# Altium footprint library 6-Connectors-3.PcbLib: 153 footprints (part 5 of 11) (continued)
## PHOENIX_1755778 [mm] "PCB Header, 12A 250 V, Pitch: 2.54mm, 6 Positions, MSTBVA Serie" (continued)
  text "6" at 12.365,3.46 h1
  text "5" at 7.285,3.46 h1
  text "1" at -12.86,3.46 h1
  text "5" at 7.285,3.46 h1
  text "4" at 2.205,3.46 h1
  text "3" at -2.875,3.46 h1
  text "2" at -7.955,3.46 h1
Mechanical 8:
  lines w0.1: -13.2,0 -12.7,0 ; -12.7,-0.5 -12.7,0 ; -12.7,0.5 -12.7,0 ; -12.2,0 -12.7,0 ; -8.12,0 -7.62,0 ; -7.62,-0.5 -7.62,0 ; -7.62,0.5 -7.62,0 ; -7.12,0 -7.62,0 ; -3.04,0 -2.54,0 ; -2.54,-0.5 -2.54,0 ; -2.54,0.5 -2.54,0 ; -2.04,0 -2.54,0 ; -0.5,0 0,0 ; 0,-0.5 0,0 ; 0,0.5 0,0 ; 0.5,0 0,0 ; 2.04,0 2.54,0 ; 2.54,-0.5 2.54,0 ; 2.54,0.5 2.54,0 ; 3.04,0 2.54,0 ; 7.12,0 7.62,0 ; 7.62,-0.5 7.62,0 ; 7.62,0.5 7.62,0 ; 8.12,0 7.62,0 ; 12.2,0 12.7,0 ; 12.7,-0.5 12.7,0 ; 12.7,0.5 12.7,0 ; 13.2,0 12.7,0
Mechanical 14:
  drawing of 207 lines, arcs and shapes, not listed
  text "6" at 12.365,3.46 h1
  text "5" at 7.285,3.46 h1
  text "5" at 7.285,3.46 h1
  text "4" at 2.205,3.46 h1
  text "3" at -2.875,3.46 h1
  text "2" at -7.955,3.46 h1
  text "1" at -12.86,3.46 h1
3D body "PHOENIX_1755778.stp": height 12, standoff -3.9, extent -16.24,-3.8 16.24,4.8

## PHOENIX_1755794 [mm] "PCB Header, 12A 250 V, Pitch: 2.54mm, 8 Positions, MSTBVA Serie"
height 12
pads (8):
  round 2.1 hole 1.4: 1(-17.78,0) 2(-12.7,0) 3(-7.62,0) 4(-2.54,0) 5(2.54,0) 6(7.62,0) 7(12.7,0) 8(17.78,0)
Top Overlay:
  drawing of 154 lines, arcs and shapes, not listed
  text "5" at 2.205,3.46 h1
  text "4" at -2.875,3.46 h1
  text "3" at -7.955,3.46 h1
  text "2" at -13.035,3.46 h1
  text "1" at -17.94,3.46 h1
  text "6" at 7.285,3.46 h1
  text "7" at 12.365,3.46 h1
  text "8" at 17.445,3.46 h1
Mechanical 8:
  lines w0.1: -18.28,0 -17.78,0 ; -17.78,-0.5 -17.78,0 ; -17.78,0.5 -17.78,0 ; -17.28,0 -17.78,0 ; -13.2,0 -12.7,0 ; -12.7,-0.5 -12.7,0 ; -12.7,0.5 -12.7,0 ; -12.2,0 -12.7,0 ; -8.12,0 -7.62,0 ; -7.62,-0.5 -7.62,0 ; -7.62,0.5 -7.62,0 ; -7.12,0 -7.62,0 ; -3.04,0 -2.54,0 ; -2.54,-0.5 -2.54,0 ; -2.54,0.5 -2.54,0 ; -2.04,0 -2.54,0 ; -0.5,0 0,0 ; 0,-0.5 0,0 ; 0,0.5 0,0 ; 0.5,0 0,0 ; 2.04,0 2.54,0 ; 2.54,-0.5 2.54,0 ; 2.54,0.5 2.54,0 ; 3.04,0 2.54,0 ; 7.12,0 7.62,0 ; 7.62,-0.5 7.62,0 ; 7.62,0.5 7.62,0 ; 8.12,0 7.62,0 ; 12.2,0 12.7,0 ; 12.7,-0.5 12.7,0 ; 12.7,0.5 12.7,0 ; 13.2,0 12.7,0 ; 17.28,0 17.78,0 ; 17.78,-0.5 17.78,0 ; 17.78,0.5 17.78,0 ; 18.28,0 17.78,0
Mechanical 14:
  drawing of 259 lines, arcs and shapes, not listed
  text "5" at 2.205,3.46 h1
  text "4" at -2.875,3.46 h1
  text "3" at -7.955,3.46 h1
  text "2" at -13.035,3.46 h1
  text "1" at -17.94,3.46 h1
  text "6" at 7.285,3.46 h1
  text "7" at 12.365,3.46 h1
  text "8" at 17.445,3.46 h1
3D body "PHOENIX_1755794.stp": height 12, standoff -3.9, extent -21.32,-3.8 21.32,4.8

## PHOENIX_1757242 [mm] "PHOENIX MSTBA Serie, Pitch 5.08mm, 12A, 250V, 2 Positions Header"
height 8.6
pads (2):
  round 2.1 hole 1.4: 1(-2.54,0) 2(2.54,0)
Top Overlay:
  lines w0.2: -6.08,-8.626 6.08,-8.626 ; -6.08,-7 6.08,-7 ; -3.515,-10 -3.145,-8.7 -1.935,-8.7 -1.565,-10 ; -3.196,-8.88 -1.884,-8.88 ; -2.785,-8.7 -2.772,-8.75 -2.308,-8.75 -2.295,-8.7 ; 1.565,-10 1.935,-8.7 3.145,-8.7 3.515,-10 ; 1.884,-8.88 3.196,-8.88 ; 2.295,-8.7 2.308,-8.75 2.772,-8.75 2.785,-8.7 ; -6.08,-10 6.08,-10 6.08,2 -6.08,2 -6.08,-10 ; -5.281,-1.05 -5.08,-1.8 -4.879,-1.05 -5.281,-1.05 ; -0.201,-1.05 0,-1.8 0.201,-1.05 -0.201,-1.05 ; 4.879,-1.05 5.08,-1.8 5.281,-1.05 4.879,-1.05
  text "1" at -2.9,-2.4 h1
  text "2" at 2.1,-2.4 h1
Mechanical 8:
  lines w0.1: -3.04,0 -2.54,0 ; -2.54,-0.5 -2.54,0 ; -2.54,0.5 -2.54,0 ; -2.04,0 -2.54,0 ; -0.5,0 0,0 ; 0,-0.5 0,0 ; 0,0.5 0,0 ; 0.5,0 0,0 ; 2.04,0 2.54,0 ; 2.54,-0.5 2.54,0 ; 2.54,0.5 2.54,0 ; 3.04,0 2.54,0
Mechanical 14:
  lines w0.1: -6.08,-8.626 6.08,-8.626 ; -6.08,-7 6.08,-7 ; -3.515,-10 -3.145,-8.7 -1.935,-8.7 -1.565,-10 ; -3.196,-8.88 -1.884,-8.88 ; -2.785,-8.7 -2.772,-8.75 -2.308,-8.75 -2.295,-8.7 ; 1.565,-10 1.935,-8.7 3.145,-8.7 3.515,-10 ; 1.884,-8.88 3.196,-8.88 ; 2.295,-8.7 2.308,-8.75 2.772,-8.75 2.785,-8.7 ; -6.08,-10 6.08,-10 6.08,2 -6.08,2 -6.08,-10 ; -5.281,-1.05 -5.08,-1.8 -4.879,-1.05 -5.281,-1.05 ; -0.201,-1.05 0,-1.8 0.201,-1.05 -0.201,-1.05 ; 4.879,-1.05 5.08,-1.8 5.281,-1.05 4.879,-1.05
3D body "PHOENIX_1757242.stp": height 8.6, standoff -3, extent -6.08,-10 6.08,2.002

## PHOENIX_1757255 [mm] "PHOENIX MSTBA Serie, Pitch 5.08mm, 12A, 250V, 3 Positions Header"
height 8.6
pads (3):
  round 2.1 hole 1.4: 1(-5.08,0) 2(0,0) 3(5.08,0)
Top Overlay:
  lines w0.2: -8.62,-8.626 8.62,-8.626 ; -8.62,-7 8.62,-7 ; -6.055,-10 -5.685,-8.7 -4.475,-8.7 -4.105,-10 ; -5.736,-8.88 -4.424,-8.88 ; -5.325,-8.7 -5.312,-8.75 -4.848,-8.75 -4.835,-8.7 ; -0.975,-10 -0.605,-8.7 0.605,-8.7 0.975,-10 ; -0.656,-8.88 0.656,-8.88 ; -0.245,-8.7 -0.232,-8.75 0.232,-8.75 0.245,-8.7 ; 4.105,-10 4.475,-8.7 5.685,-8.7 6.055,-10 ; 4.424,-8.88 5.736,-8.88 ; 4.835,-8.7 4.848,-8.75 5.312,-8.75 5.325,-8.7 ; -8.62,-10 8.62,-10 8.62,2 -8.62,2 -8.62,-10 ; -2.741,-1.05 -2.54,-1.8 -2.339,-1.05 -2.741,-1.05 ; 2.339,-1.05 2.54,-1.8 2.741,-1.05 2.339,-1.05
  text "3" at 4.64,-2.4 h1
  text "2" at -0.36,-2.4 h1
  text "1" at -5.36,-2.4 h1
Mechanical 8:
  lines w0.1: -5.58,0 -5.08,0 ; -5.08,-0.5 -5.08,0 ; -5.08,0.5 -5.08,0 ; -4.58,0 -5.08,0 ; 4.58,0 5.08,0 ; 5.08,-0.5 5.08,0 ; 5.08,0.5 5.08,0 ; 5.58,0 5.08,0 ; 0,0 0,0.5 0,0 ; 0,0 0.5,0 0,0 ; 0,0 0,-0.5 0,0 ; 0,0 -0.5,0 0,0
Mechanical 14:
  lines w0.1: -8.62,-8.626 8.62,-8.626 ; -8.62,-7 8.62,-7 ; -6.055,-10 -5.685,-8.7 -4.475,-8.7 -4.105,-10 ; -5.736,-8.88 -4.424,-8.88 ; -5.325,-8.7 -5.312,-8.75 -4.848,-8.75 -4.835,-8.7 ; -0.975,-10 -0.605,-8.7 0.605,-8.7 0.975,-10 ; -0.656,-8.88 0.656,-8.88 ; -0.245,-8.7 -0.232,-8.75 0.232,-8.75 0.245,-8.7 ; 4.105,-10 4.475,-8.7 5.685,-8.7 6.055,-10 ; 4.424,-8.88 5.736,-8.88 ; 4.835,-8.7 4.848,-8.75 5.312,-8.75 5.325,-8.7 ; -8.62,-10 8.62,-10 8.62,2 -8.62,2 -8.62,-10 ; -2.741,-1.05 -2.54,-1.8 -2.339,-1.05 -2.741,-1.05 ; 2.339,-1.05 2.54,-1.8 2.741,-1.05 2.339,-1.05
3D body "PHOENIX_1757255.stp": height 8.6, standoff -3.5, extent -8.62,-10 8.62,2.002

## PHOENIX_1757268 [mm] "PHOENIX MSTBA Serie, Pitch 5.08mm, 12A, 250V, 4 Positions Header"
height 8.6
pads (4):
  round 2.1 hole 1.4: 1(-7.62,0) 2(-2.54,0) 3(2.54,0) 4(7.62,0)
Top Overlay:
  lines w0.2: -11.16,-8.626 11.16,-8.626 ; -11.16,-7 11.16,-7 ; -8.595,-10 -8.225,-8.7 -7.015,-8.7 -6.645,-10 ; -8.276,-8.88 -6.964,-8.88 ; -3.515,-10 -3.145,-8.7 -1.935,-8.7 -1.565,-10 ; -3.196,-8.88 -1.884,-8.88 ; 1.565,-10 1.935,-8.7 3.145,-8.7 3.515,-10 ; 1.884,-8.88 3.196,-8.88 ; 6.645,-10 7.015,-8.7 8.225,-8.7 8.595,-10 ; 6.964,-8.88 8.276,-8.88 ; -11.16,-10 -11.16,2 11.16,2 11.16,-10 -11.16,-10 ; -5.281,-1.05 -4.879,-1.05 -5.08,-1.8 -5.281,-1.05 ; -0.201,-1.05 0.201,-1.05 0,-1.8 -0.201,-1.05 ; 4.879,-1.05 5.281,-1.05 5.08,-1.8 4.879,-1.05
  text "3" at 2.1,-2.4 h1
  text "2" at -2.9,-2.4 h1
  text "1" at -7.9,-2.4 h1
  text "4" at 7.3,-2.4 h1
Mechanical 8:
  lines w0.1: -8.12,0 -7.62,0 ; -7.62,-0.5 -7.62,0 ; -7.62,0.5 -7.62,0 ; -7.12,0 -7.62,0 ; -3.04,0 -2.54,0 ; -2.54,-0.5 -2.54,0 ; -2.54,0.5 -2.54,0 ; -2.04,0 -2.54,0 ; -0.5,0 0,0 ; 0,-0.5 0,0 ; 0,0.5 0,0 ; 0.5,0 0,0 ; 2.04,0 2.54,0 ; 2.54,-0.5 2.54,0 ; 2.54,0.5 2.54,0 ; 3.04,0 2.54,0 ; 7.12,0 7.62,0 ; 7.62,-0.5 7.62,0 ; 7.62,0.5 7.62,0 ; 8.12,0 7.62,0
Mechanical 14:
  lines w0.1: -11.16,-8.626 11.16,-8.626 ; -11.16,-7 11.16,-7 ; -8.595,-10 -8.225,-8.7 -7.015,-8.7 -6.645,-10 ; -8.276,-8.88 -6.964,-8.88 ; -7.865,-8.7 -7.852,-8.75 -7.388,-8.75 -7.375,-8.7 ; -3.515,-10 -3.145,-8.7 -1.935,-8.7 -1.565,-10 ; -3.196,-8.88 -1.884,-8.88 ; -2.785,-8.7 -2.772,-8.75 -2.308,-8.75 -2.295,-8.7 ; 1.565,-10 1.935,-8.7 3.145,-8.7 3.515,-10 ; 1.884,-8.88 3.196,-8.88 ; 2.295,-8.7 2.308,-8.75 2.772,-8.75 2.785,-8.7 ; 6.645,-10 7.015,-8.7 8.225,-8.7 8.595,-10 ; 6.964,-8.88 8.276,-8.88 ; 7.375,-8.7 7.388,-8.75 7.852,-8.75 7.865,-8.7 ; -11.16,-10 -11.16,2 11.16,2 11.16,-10 -11.16,-10 ; -5.281,-1.05 -4.879,-1.05 -5.08,-1.8 -5.281,-1.05 ; -0.201,-1.05 0.201,-1.05 0,-1.8 -0.201,-1.05 ; 4.879,-1.05 5.281,-1.05 5.08,-1.8 4.879,-1.05
3D body "PHOENIX_1757268.stp": height 8.6, standoff -3.5, extent -11.16,-10 11.16,2.002

## PHOENIX_1757271 [mm] "PHOENIX MSTBA Serie, Pitch 5.08mm, 12A, 250V, 5 Positions Header"
height 8.6
pads (5):
  round 2.1 hole 1.4: 1(-10.16,0) 2(-5.08,0) 3(0,0) 4(5.08,0) 5(10.16,0)
Top Overlay:
  lines w0.2: -13.7,-8.626 13.7,-8.626 ; -13.7,-7 13.7,-7 ; -11.135,-10 -10.765,-8.7 -9.555,-8.7 -9.185,-10 ; -10.816,-8.88 -9.504,-8.88 ; -10.405,-8.7 -10.392,-8.75 -9.928,-8.75 -9.915,-8.7 ; -6.055,-10 -5.685,-8.7 -4.475,-8.7 -4.105,-10 ; -5.736,-8.88 -4.424,-8.88 ; -5.325,-8.7 -5.312,-8.75 -4.848,-8.75 -4.835,-8.7 ; -0.975,-10 -0.605,-8.7 0.605,-8.7 0.975,-10 ; -0.656,-8.88 0.656,-8.88 ; -0.245,-8.7 -0.232,-8.75 0.232,-8.75 0.245,-8.7 ; 4.105,-10 4.475,-8.7 5.685,-8.7 6.055,-10 ; 4.424,-8.88 5.736,-8.88 ; 4.835,-8.7 4.848,-8.75 5.312,-8.75 5.325,-8.7 ; 9.185,-10 9.555,-8.7 10.765,-8.7 11.135,-10 ; 9.504,-8.88 10.816,-8.88 ; 9.915,-8.7 9.928,-8.75 10.392,-8.75 10.405,-8.7 ; -13.7,-10 -13.7,2 13.7,2 13.7,-10 -13.7,-10 ; -7.821,-1.05 -7.62,-1.8 -7.419,-1.05 -7.821,-1.05 ; -2.741,-1.05 -2.54,-1.8 -2.339,-1.05 -2.741,-1.05 ; 2.339,-1.05 2.54,-1.8 2.741,-1.05 2.339,-1.05 ; 7.419,-1.05 7.62,-1.8 7.821,-1.05 7.419,-1.05
  text "5" at 9.72,-2.4 h1
  text "4" at 4.64,-2.4 h1
  text "3" at -0.44,-2.4 h1
  text "2" at -5.44,-2.4 h1
  text "1" at -10.44,-2.4 h1
Mechanical 8:
  lines w0.1: -0.5,0 0,0 ; 0,-0.5 0,0 ; 0,0.5 0,0 ; 0.5,0 0,0 ; -10.16,0 -10.66,0 -10.16,0 ; -10.16,0 -10.16,-0.5 -10.16,0 ; -10.16,0 -9.66,0 -10.16,0 ; -10.16,0 -10.16,0.5 -10.16,0 ; -5.08,0 -5.58,0 -5.08,0 ; -5.08,0 -5.08,-0.5 -5.08,0 ; -5.08,0 -4.58,0 -5.08,0 ; -5.08,0 -5.08,0.5 -5.08,0 ; 5.08,0 4.58,0 5.08,0 ; 5.08,0 5.08,-0.5 5.08,0 ; 5.08,0 5.58,0 5.08,0 ; 5.08,0 5.08,0.5 5.08,0 ; 10.16,0 9.66,0 10.16,0 ; 10.16,0 10.16,-0.5 10.16,0 ; 10.16,0 10.66,0 10.16,0 ; 10.16,0 10.16,0.5 10.16,0
Mechanical 14:
  lines w0.1: -13.7,-8.626 13.7,-8.626 ; -13.7,-7 13.7,-7 ; -11.135,-10 -10.765,-8.7 -9.555,-8.7 -9.185,-10 ; -10.816,-8.88 -9.504,-8.88 ; -10.405,-8.7 -10.392,-8.75 -9.928,-8.75 -9.915,-8.7 ; -6.055,-10 -5.685,-8.7 -4.475,-8.7 -4.105,-10 ; -5.736,-8.88 -4.424,-8.88 ; -5.325,-8.7 -5.312,-8.75 -4.848,-8.75 -4.835,-8.7 ; -0.975,-10 -0.605,-8.7 0.605,-8.7 0.975,-10 ; -0.656,-8.88 0.656,-8.88 ; -0.245,-8.7 -0.232,-8.75 0.232,-8.75 0.245,-8.7 ; 4.105,-10 4.475,-8.7 5.685,-8.7 6.055,-10 ; 4.424,-8.88 5.736,-8.88 ; 4.835,-8.7 4.848,-8.75 5.312,-8.75 5.325,-8.7 ; 9.185,-10 9.555,-8.7 10.765,-8.7 11.135,-10 ; 9.504,-8.88 10.816,-8.88 ; 9.915,-8.7 9.928,-8.75 10.392,-8.75 10.405,-8.7 ; -13.7,-10 -13.7,2 13.7,2 13.7,-10 -13.7,-10 ; -7.821,-1.05 -7.62,-1.8 -7.419,-1.05 -7.821,-1.05 ; -2.741,-1.05 -2.54,-1.8 -2.339,-1.05 -2.741,-1.05 ; 2.339,-1.05 2.54,-1.8 2.741,-1.05 2.339,-1.05 ; 7.419,-1.05 7.62,-1.8 7.821,-1.05 7.419,-1.05
3D body "PHOENIX_1757271.stp": height 8.6, standoff -3.5, extent -13.7,-10 13.7,2.002

## PHOENIX_1757284 [mm] "PHOENIX MSTBA Serie, Pitch 5.08mm, 12A, 250V, 6 Positions Header"
height 8.6
pads (6):
  round 2.1 hole 1.4: 1(-12.7,0) 2(-7.62,0) 3(-2.54,0) 4(2.54,0) 5(7.62,0) 6(12.7,0)
Top Overlay:
  lines w0.2: -16.24,-8.626 16.24,-8.626 ; -16.24,-7 16.24,-7 ; -13.675,-10 -13.305,-8.7 -12.095,-8.7 -11.725,-10 ; -13.356,-8.88 -12.044,-8.88 ; -12.945,-8.7 -12.932,-8.75 -12.468,-8.75 -12.455,-8.7 ; -8.595,-10 -8.225,-8.7 -7.015,-8.7 -6.645,-10 ; -8.276,-8.88 -6.964,-8.88 ; -7.865,-8.7 -7.852,-8.75 -7.388,-8.75 -7.375,-8.7 ; -3.515,-10 -3.145,-8.7 -1.935,-8.7 -1.565,-10 ; -3.196,-8.88 -1.884,-8.88 ; -2.785,-8.7 -2.772,-8.75 -2.308,-8.75 -2.295,-8.7 ; 1.565,-10 1.935,-8.7 3.145,-8.7 3.515,-10 ; 1.884,-8.88 3.196,-8.88 ; 2.295,-8.7 2.308,-8.75 2.772,-8.75 2.785,-8.7 ; 6.645,-10 7.015,-8.7 8.225,-8.7 8.595,-10 ; 6.964,-8.88 8.276,-8.88 ; 7.375,-8.7 7.388,-8.75 7.852,-8.75 7.865,-8.7 ; 11.725,-10 12.095,-8.7 13.305,-8.7 13.675,-10 ; 12.044,-8.88 13.356,-8.88 ; 12.455,-8.7 12.468,-8.75 12.932,-8.75 12.945,-8.7 ; -16.24,-10 16.24,-10 16.24,2 -16.24,2 -16.24,-10 ; -10.361,-1.05 -9.959,-1.05 -10.16,-1.8 -10.361,-1.05 ; -5.281,-1.05 -4.879,-1.05 -5.08,-1.8 -5.281,-1.05 ; -0.201,-1.05 0.201,-1.05 0,-1.8 -0.201,-1.05 ; 4.879,-1.05 5.281,-1.05 5.08,-1.8 4.879,-1.05 ; 9.959,-1.05 10.361,-1.05 10.16,-1.8 9.959,-1.05
  text "4" at 2.22,-2.4 h1
  text "1" at -12.98,-2.4 h1
  text "2" at -7.98,-2.4 h1
  text "3" at -2.98,-2.4 h1
  text "5" at 7.3,-2.4 h1
  text "6" at 12.38,-2.4 h1
Mechanical 8:
  lines w0.1: -0.5,0 0,0 ; 0,-0.5 0,0 ; 0,0.5 0,0 ; 0.5,0 0,0 ; -12.7,0 -12.7,0.5 -12.7,0 ; -12.7,0 -12.2,0 -12.7,0 ; -12.7,0 -12.7,-0.5 -12.7,0 ; -12.7,0 -13.2,0 -12.7,0 ; -7.62,0 -7.62,0.5 -7.62,0 ; -7.62,0 -7.12,0 -7.62,0 ; -7.62,0 -7.62,-0.5 -7.62,0 ; -7.62,0 -8.12,0 -7.62,0 ; -2.54,0 -2.54,0.5 -2.54,0 ; -2.54,0 -2.04,0 -2.54,0 ; -2.54,0 -2.54,-0.5 -2.54,0 ; -2.54,0 -3.04,0 -2.54,0 ; 2.54,0 2.54,0.5 2.54,0 ; 2.54,0 3.04,0 2.54,0 ; 2.54,0 2.54,-0.5 2.54,0 ; 2.54,0 2.04,0 2.54,0 ; 7.62,0 7.62,0.5 7.62,0 ; 7.62,0 8.12,0 7.62,0 ; 7.62,0 7.62,-0.5 7.62,0 ; 7.62,0 7.12,0 7.62,0 ; 12.7,0 12.7,0.5 12.7,0 ; 12.7,0 13.2,0 12.7,0 ; 12.7,0 12.7,-0.5 12.7,0 ; 12.7,0 12.2,0 12.7,0
Mechanical 14:
  lines w0.1: -16.24,-8.626 16.24,-8.626 ; -16.24,-7 16.24,-7 ; -13.675,-10 -13.305,-8.7 -12.095,-8.7 -11.725,-10 ; -13.356,-8.88 -12.044,-8.88 ; -12.945,-8.7 -12.932,-8.75 -12.468,-8.75 -12.455,-8.7 ; -8.595,-10 -8.225,-8.7 -7.015,-8.7 -6.645,-10 ; -8.276,-8.88 -6.964,-8.88 ; -7.865,-8.7 -7.852,-8.75 -7.388,-8.75 -7.375,-8.7 ; -3.515,-10 -3.145,-8.7 -1.935,-8.7 -1.565,-10 ; -3.196,-8.88 -1.884,-8.88 ; -2.785,-8.7 -2.772,-8.75 -2.308,-8.75 -2.295,-8.7 ; 1.565,-10 1.935,-8.7 3.145,-8.7 3.515,-10 ; 1.884,-8.88 3.196,-8.88 ; 2.295,-8.7 2.308,-8.75 2.772,-8.75 2.785,-8.7 ; 6.645,-10 7.015,-8.7 8.225,-8.7 8.595,-10 ; 6.964,-8.88 8.276,-8.88 ; 7.375,-8.7 7.388,-8.75 7.852,-8.75 7.865,-8.7 ; 11.725,-10 12.095,-8.7 13.305,-8.7 13.675,-10 ; 12.044,-8.88 13.356,-8.88 ; 12.455,-8.7 12.468,-8.75 12.932,-8.75 12.945,-8.7 ; -16.24,-10 16.24,-10 16.24,2 -16.24,2 -16.24,-10 ; -10.361,-1.05 -9.959,-1.05 -10.16,-1.8 -10.361,-1.05 ; -5.281,-1.05 -4.879,-1.05 -5.08,-1.8 -5.281,-1.05 ; -0.201,-1.05 0.201,-1.05 0,-1.8 -0.201,-1.05 ; 4.879,-1.05 5.281,-1.05 5.08,-1.8 4.879,-1.05 ; 9.959,-1.05 10.361,-1.05 10.16,-1.8 9.959,-1.05
3D body "PHOENIX_1757284.stp": height 8.6, standoff -3.5, extent -16.24,-10 16.24,2

## PHOENIX_1757307 [mm] "PHOENIX MSTBA Serie, Pitch 5.08mm, 12A, 250V, 8 Positions Header"
height 8.6
pads (8):
  round 2.1 hole 1.4: 1(-17.78,0) 2(-12.7,0) 3(-7.62,0) 4(-2.54,0) 5(2.54,0) 6(7.62,0) 7(12.7,0) 8(17.78,0)
Top Overlay:
  lines w0.2: -21.32,-8.626 21.32,-8.626 ; -21.32,-7 21.32,-7 ; -18.755,-10 -18.385,-8.7 -17.175,-8.7 -16.805,-10 ; -18.436,-8.88 -17.124,-8.88 ; -13.675,-10 -13.305,-8.7 -12.095,-8.7 -11.725,-10 ; -13.356,-8.88 -12.044,-8.88 ; -8.595,-10 -8.225,-8.7 -7.015,-8.7 -6.645,-10 ; -8.276,-8.88 -6.964,-8.88 ; -3.515,-10 -3.145,-8.7 -1.935,-8.7 -1.565,-10 ; -3.196,-8.88 -1.884,-8.88 ; 1.565,-10 1.935,-8.7 3.145,-8.7 3.515,-10 ; 1.884,-8.88 3.196,-8.88 ; 6.645,-10 7.015,-8.7 8.225,-8.7 8.595,-10 ; 6.964,-8.88 8.276,-8.88 ; 11.725,-10 12.095,-8.7 13.305,-8.7 13.675,-10 ; 12.044,-8.88 13.356,-8.88 ; 16.805,-10 17.175,-8.7 18.385,-8.7 18.755,-10 ; 17.124,-8.88 18.436,-8.88 ; -21.32,-10 -21.32,2 21.32,2 21.32,-10 -21.32,-10 ; -15.441,-1.05 -15.039,-1.05 -15.24,-1.8 -15.441,-1.05 ; -10.361,-1.05 -10.16,-1.8 -9.959,-1.05 -10.361,-1.05 ; -5.281,-1.05 -5.08,-1.8 -4.879,-1.05 -5.281,-1.05 ; -0.201,-1.05 0,-1.8 0.201,-1.05 -0.201,-1.05 ; 4.879,-1.05 5.08,-1.8 5.281,-1.05 4.879,-1.05 ; 9.959,-1.05 10.16,-1.8 10.361,-1.05 9.959,-1.05 ; 15.039,-1.05 15.441,-1.05 15.24,-1.8 15.039,-1.05
  text "3" at -8.06,-2.4 h1
  text "2" at -13.06,-2.4 h1
  text "1" at -18.06,-2.4 h1
  text "4" at -2.86,-2.4 h1
  text "7" at 12.26,-2.4 h1
  text "6" at 7.26,-2.4 h1
  text "5" at 2.26,-2.4 h1
  text "8" at 17.46,-2.4 h1
Mechanical 8:
  lines w0.1: -0.5,0 0,0 ; 0,-0.5 0,0 ; 0,0.5 0,0 ; 0.5,0 0,0 ; -17.78,0 -18.28,0 -17.78,0 ; -17.78,0 -17.78,-0.5 -17.78,0 ; -17.78,0 -17.28,0 -17.78,0 ; -17.78,0 -17.78,0.5 -17.78,0 ; -12.7,0 -13.2,0 -12.7,0 ; -12.7,0 -12.7,-0.5 -12.7,0 ; -12.7,0 -12.2,0 -12.7,0 ; -12.7,0 -12.7,0.5 -12.7,0 ; -7.62,0 -8.12,0 -7.62,0 ; -7.62,0 -7.62,-0.5 -7.62,0 ; -7.62,0 -7.12,0 -7.62,0 ; -7.62,0 -7.62,0.5 -7.62,0 ; -2.54,0 -3.04,0 -2.54,0 ; -2.54,0 -2.54,-0.5 -2.54,0 ; -2.54,0 -2.04,0 -2.54,0 ; -2.54,0 -2.54,0.5 -2.54,0 ; 2.54,0 2.04,0 2.54,0 ; 2.54,0 2.54,-0.5 2.54,0 ; 2.54,0 3.04,0 2.54,0 ; 2.54,0 2.54,0.5 2.54,0 ; 7.62,0 7.12,0 7.62,0 ; 7.62,0 7.62,-0.5 7.62,0 ; 7.62,0 8.12,0 7.62,0 ; 7.62,0 7.62,0.5 7.62,0 ; 12.7,0 12.2,0 12.7,0 ; 12.7,0 12.7,-0.5 12.7,0 ; 12.7,0 13.2,0 12.7,0 ; 12.7,0 12.7,0.5 12.7,0 ; 17.78,0 17.28,0 17.78,0 ; 17.78,0 17.78,-0.5 17.78,0 ; 17.78,0 18.28,0 17.78,0 ; 17.78,0 17.78,0.5 17.78,0
Mechanical 14:
  lines w0.1: -21.32,-8.626 21.32,-8.626 ; -21.32,-7 21.32,-7 ; -18.755,-10 -18.385,-8.7 -17.175,-8.7 -16.805,-10 ; -18.436,-8.88 -17.124,-8.88 ; -18.025,-8.7 -18.012,-8.75 -17.548,-8.75 -17.535,-8.7 ; -13.675,-10 -13.305,-8.7 -12.095,-8.7 -11.725,-10 ; -13.356,-8.88 -12.044,-8.88 ; -12.945,-8.7 -12.932,-8.75 -12.468,-8.75 -12.455,-8.7 ; -8.595,-10 -8.225,-8.7 -7.015,-8.7 -6.645,-10 ; -8.276,-8.88 -6.964,-8.88 ; -7.865,-8.7 -7.852,-8.75 -7.388,-8.75 -7.375,-8.7 ; -3.515,-10 -3.145,-8.7 -1.935,-8.7 -1.565,-10 ; -3.196,-8.88 -1.884,-8.88 ; -2.785,-8.7 -2.772,-8.75 -2.308,-8.75 -2.295,-8.7 ; 1.565,-10 1.935,-8.7 3.145,-8.7 3.515,-10 ; 1.884,-8.88 3.196,-8.88 ; 2.295,-8.7 2.308,-8.75 2.772,-8.75 2.785,-8.7 ; 6.645,-10 7.015,-8.7 8.225,-8.7 8.595,-10 ; 6.964,-8.88 8.276,-8.88 ; 7.375,-8.7 7.388,-8.75 7.852,-8.75 7.865,-8.7 ; 11.725,-10 12.095,-8.7 13.305,-8.7 13.675,-10 ; 12.044,-8.88 13.356,-8.88 ; 12.455,-8.7 12.468,-8.75 12.932,-8.75 12.945,-8.7 ; 16.805,-10 17.175,-8.7 18.385,-8.7 18.755,-10 ; 17.124,-8.88 18.436,-8.88 ; 17.535,-8.7 17.548,-8.75 18.012,-8.75 18.025,-8.7 ; -21.32,-10 -21.32,2 21.32,2 21.32,-10 -21.32,-10 ; -15.441,-1.05 -15.039,-1.05 -15.24,-1.8 -15.441,-1.05 ; -10.361,-1.05 -10.16,-1.8 -9.959,-1.05 -10.361,-1.05 ; -5.281,-1.05 -5.08,-1.8 -4.879,-1.05 -5.281,-1.05 ; -0.201,-1.05 0,-1.8 0.201,-1.05 -0.201,-1.05 ; 4.879,-1.05 5.08,-1.8 5.281,-1.05 4.879,-1.05 ; 9.959,-1.05 10.16,-1.8 10.361,-1.05 9.959,-1.05 ; 15.039,-1.05 15.441,-1.05 15.24,-1.8 15.039,-1.05
3D body "PHOENIX_1757307.stp": height 8.6, standoff -3.5, extent -21.32,-10 21.32,2

## PHOENIX_1757310 [mm] "PHOENIX MSTBA Serie, Pitch 5.08mm, 12A, 250V, 9 Positions Header"
height 8.6
pads (9):
  round 2.1 hole 1.4: 1(-20.32,0) 2(-15.24,0) 3(-10.16,0) 4(-5.08,0) 5(0,0) 6(5.08,0) 7(10.16,0) 8(15.24,0) 9(20.32,0)
Top Overlay:
  lines w0.2: -23.86,-8.626 23.86,-8.626 ; -23.86,-7 23.86,-7 ; -21.295,-10 -20.925,-8.7 -19.715,-8.7 -19.345,-10 ; -20.976,-8.88 -19.664,-8.88 ; -20.565,-8.7 -20.552,-8.75 -20.088,-8.75 -20.075,-8.7 ; -16.215,-10 -15.845,-8.7 -14.635,-8.7 -14.265,-10 ; -15.896,-8.88 -14.584,-8.88 ; -15.485,-8.7 -15.472,-8.75 -15.008,-8.75 -14.995,-8.7 ; -11.135,-10 -10.765,-8.7 -9.555,-8.7 -9.185,-10 ; -10.816,-8.88 -9.504,-8.88 ; -10.405,-8.7 -10.392,-8.75 -9.928,-8.75 -9.915,-8.7 ; -6.055,-10 -5.685,-8.7 -4.475,-8.7 -4.105,-10 ; -5.736,-8.88 -4.424,-8.88 ; -5.325,-8.7 -5.312,-8.75 -4.848,-8.75 -4.835,-8.7 ; -0.975,-10 -0.605,-8.7 0.605,-8.7 0.975,-10 ; -0.656,-8.88 0.656,-8.88 ; -0.245,-8.7 -0.232,-8.75 0.232,-8.75 0.245,-8.7 ; 4.105,-10 4.475,-8.7 5.685,-8.7 6.055,-10 ; 4.424,-8.88 5.736,-8.88 ; 4.835,-8.7 4.848,-8.75 5.312,-8.75 5.325,-8.7 ; 9.185,-10 9.555,-8.7 10.765,-8.7 11.135,-10 ; 9.504,-8.88 10.816,-8.88 ; 9.915,-8.7 9.928,-8.75 10.392,-8.75 10.405,-8.7 ; 14.265,-10 14.635,-8.7 15.845,-8.7 16.215,-10 ; 14.584,-8.88 15.896,-8.88 ; 14.995,-8.7 15.008,-8.75 15.472,-8.75 15.485,-8.7 ; 19.345,-10 19.715,-8.7 20.925,-8.7 21.295,-10 ; 19.664,-8.88 20.976,-8.88 ; 20.075,-8.7 20.088,-8.75 20.552,-8.75 20.565,-8.7 ; -23.86,-10 -23.86,2 23.86,2 23.86,-10 -23.86,-10 ; -17.981,-1.05 -17.78,-1.8 -17.579,-1.05 -17.981,-1.05 ; -12.901,-1.05 -12.7,-1.8 -12.499,-1.05 -12.901,-1.05 ; -7.821,-1.05 -7.62,-1.8 -7.419,-1.05 -7.821,-1.05 ; -2.741,-1.05 -2.54,-1.8 -2.339,-1.05 -2.741,-1.05 ; 2.339,-1.05 2.54,-1.8 2.741,-1.05 2.339,-1.05 ; 7.419,-1.05 7.62,-1.8 7.821,-1.05 7.419,-1.05 ; 12.499,-1.05 12.7,-1.8 12.901,-1.05 12.499,-1.05 ; 17.579,-1.05 17.78,-1.8 17.981,-1.05 17.579,-1.05
  text "3" at -10.6,-2.4 h1
  text "2" at -15.6,-2.4 h1
  text "1" at -20.6,-2.4 h1
  text "4" at -5.4,-2.4 h1
  text "7" at 9.72,-2.4 h1
  text "6" at 4.72,-2.4 h1
  text "5" at -0.28,-2.4 h1
  text "8" at 14.92,-2.4 h1
  text "9" at 20,-2.4 h1
Mechanical 8:
  lines w0.1: -0.5,0 0,0 ; 0,-0.5 0,0 ; 0,0.5 0,0 ; 0.5,0 0,0 ; -20.32,0 -20.82,0 -20.32,0 ; -20.32,0 -20.32,-0.5 -20.32,0 ; -20.32,0 -19.82,0 -20.32,0 ; -20.32,0 -20.32,0.5 -20.32,0 ; -15.24,0 -15.74,0 -15.24,0 ; -15.24,0 -15.24,-0.5 -15.24,0 ; -15.24,0 -14.74,0 -15.24,0 ; -15.24,0 -15.24,0.5 -15.24,0 ; -10.16,0 -10.66,0 -10.16,0 ; -10.16,0 -10.16,-0.5 -10.16,0 ; -10.16,0 -9.66,0 -10.16,0 ; -10.16,0 -10.16,0.5 -10.16,0 ; -5.08,0 -5.58,0 -5.08,0 ; -5.08,0 -5.08,-0.5 -5.08,0 ; -5.08,0 -4.58,0 -5.08,0 ; -5.08,0 -5.08,0.5 -5.08,0 ; 5.08,0 4.58,0 5.08,0 ; 5.08,0 5.08,-0.5 5.08,0 ; 5.08,0 5.58,0 5.08,0 ; 5.08,0 5.08,0.5 5.08,0 ; 10.16,0 9.66,0 10.16,0 ; 10.16,0 10.16,-0.5 10.16,0 ; 10.16,0 10.66,0 10.16,0 ; 10.16,0 10.16,0.5 10.16,0 ; 15.24,0 14.74,0 15.24,0 ; 15.24,0 15.24,-0.5 15.24,0 ; 15.24,0 15.74,0 15.24,0 ; 15.24,0 15.24,0.5 15.24,0 ; 20.32,0 19.82,0 20.32,0 ; 20.32,0 20.32,-0.5 20.32,0 ; 20.32,0 20.82,0 20.32,0 ; 20.32,0 20.32,0.5 20.32,0
Mechanical 14:
  lines w0.1: -23.86,-8.626 23.86,-8.626 ; -23.86,-7 23.86,-7 ; -21.295,-10 -20.925,-8.7 -19.715,-8.7 -19.345,-10 ; -20.976,-8.88 -19.664,-8.88 ; -20.565,-8.7 -20.552,-8.75 -20.088,-8.75 -20.075,-8.7 ; -16.215,-10 -15.845,-8.7 -14.635,-8.7 -14.265,-10 ; -15.896,-8.88 -14.584,-8.88 ; -15.485,-8.7 -15.472,-8.75 -15.008,-8.75 -14.995,-8.7 ; -11.135,-10 -10.765,-8.7 -9.555,-8.7 -9.185,-10 ; -10.816,-8.88 -9.504,-8.88 ; -10.405,-8.7 -10.392,-8.75 -9.928,-8.75 -9.915,-8.7 ; -6.055,-10 -5.685,-8.7 -4.475,-8.7 -4.105,-10 ; -5.736,-8.88 -4.424,-8.88 ; -5.325,-8.7 -5.312,-8.75 -4.848,-8.75 -4.835,-8.7 ; -0.975,-10 -0.605,-8.7 0.605,-8.7 0.975,-10 ; -0.656,-8.88 0.656,-8.88 ; -0.245,-8.7 -0.232,-8.75 0.232,-8.75 0.245,-8.7 ; 4.105,-10 4.475,-8.7 5.685,-8.7 6.055,-10 ; 4.424,-8.88 5.736,-8.88 ; 4.835,-8.7 4.848,-8.75 5.312,-8.75 5.325,-8.7 ; 9.185,-10 9.555,-8.7 10.765,-8.7 11.135,-10 ; 9.504,-8.88 10.816,-8.88 ; 9.915,-8.7 9.928,-8.75 10.392,-8.75 10.405,-8.7 ; 14.265,-10 14.635,-8.7 15.845,-8.7 16.215,-10 ; 14.584,-8.88 15.896,-8.88 ; 14.995,-8.7 15.008,-8.75 15.472,-8.75 15.485,-8.7 ; 19.345,-10 19.715,-8.7 20.925,-8.7 21.295,-10 ; 19.664,-8.88 20.976,-8.88 ; 20.075,-8.7 20.088,-8.75 20.552,-8.75 20.565,-8.7 ; -23.86,-10 -23.86,2 23.86,2 23.86,-10 -23.86,-10 ; -17.981,-1.05 -17.78,-1.8 -17.579,-1.05 -17.981,-1.05 ; -12.901,-1.05 -12.7,-1.8 -12.499,-1.05 -12.901,-1.05 ; -7.821,-1.05 -7.62,-1.8 -7.419,-1.05 -7.821,-1.05 ; -2.741,-1.05 -2.54,-1.8 -2.339,-1.05 -2.741,-1.05 ; 2.339,-1.05 2.54,-1.8 2.741,-1.05 2.339,-1.05 ; 7.419,-1.05 7.62,-1.8 7.821,-1.05 7.419,-1.05 ; 12.499,-1.05 12.7,-1.8 12.901,-1.05 12.499,-1.05 ; 17.579,-1.05 17.78,-1.8 17.981,-1.05 17.579,-1.05
3D body "PHOENIX_1757310.stp": height 8.6, standoff -3.5, extent -23.86,-10 23.86,2